# Altium integrated library Diffuser.IntLib: 173 symbols
Pins are listed as number, name and electrical type; pins without a type are passive.

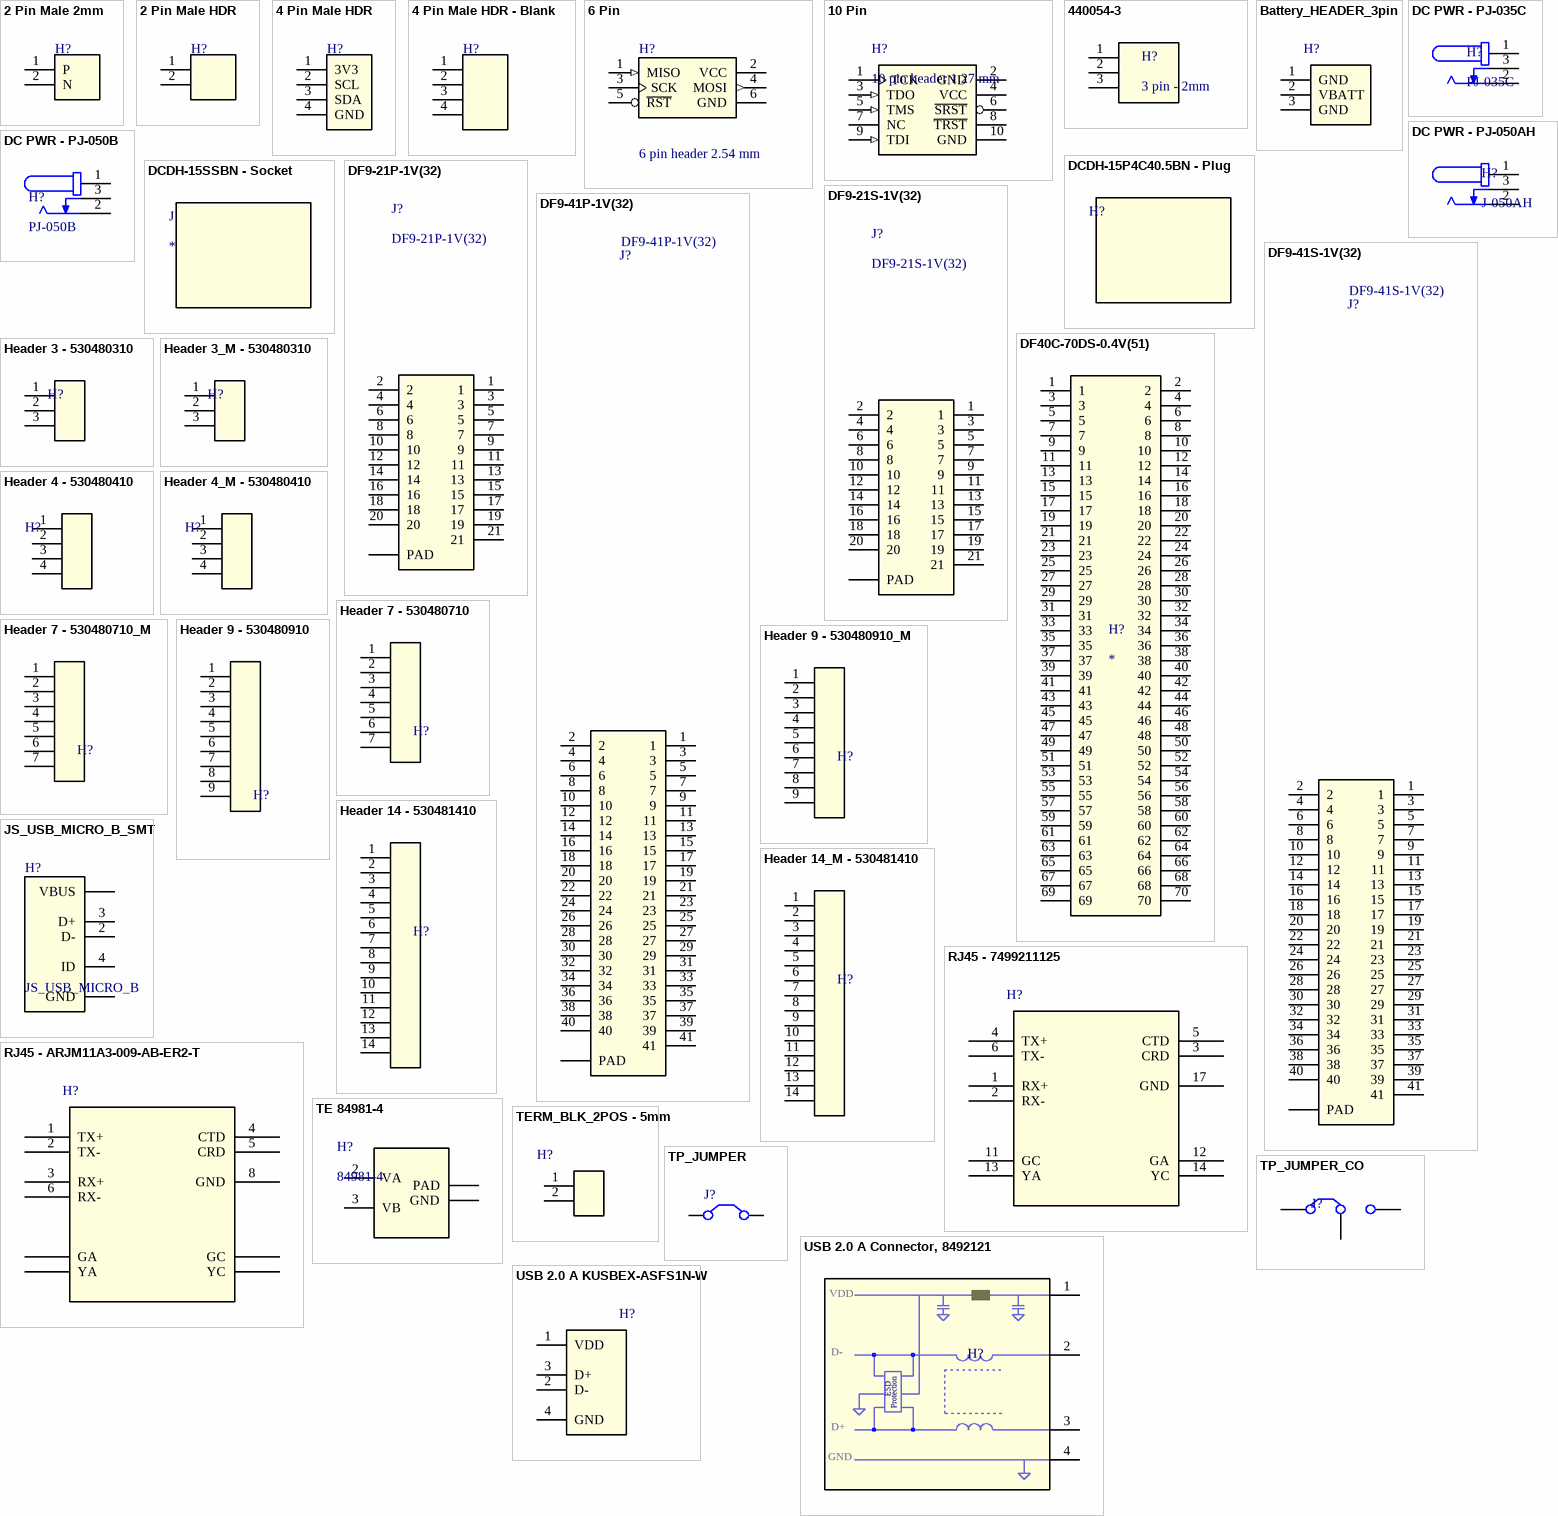
[diagram p0: symbols 2 Pin Male 2mm to USB 2.0 A KUSBEX-ASFS1N-W]

## 2 Pin Male 2mm
designator H?
CONN HDR 2POS 0.1 TIN PCB
footprint JST_B2B-PH-K-S
pins: 1 P, 2 N

## 2 Pin Male HDR
designator H?
CONN HDR 2POS 0.1 TIN PCB
footprint 2 Pin HDR (2.54mm - Single row)
pins: 1, 2

## 4 Pin Male HDR
designator H?
CONN HDR 4POS 0.1 TIN PCB; Website: https://www.digikey.co.nz/product-detail/en/sullins-connector-solutions/PPTC041LFBN-RC/S7002-ND/810144; Cost: 0.71
footprint 4 Pin HDR (2.54mm - Single row)
pins: 1 3V3, 2 SCL, 3 SDA, 4 GND

## 4 Pin Male HDR - Blank
designator H?
CONN HDR 4POS 0.1 TIN PCB; Website: https://www.digikey.co.nz/product-detail/en/sullins-connector-solutions/PPTC041LFBN-RC/S7002-ND/810144; Cost: 0.71
footprint 4 Pin HDR (2.54mm - Single row)
pins: 1, 2, 3, 4

## 6 Pin
designator H?, comment 6 pin header 2.54 mm
IDC Header, 2,54mm, 6-Pin, Vert; Cost: 0.71; Website: https://www.digikey.co.nz/product-detail/en/w%C3%BCrth-elektronik/61200621621/732-5394-ND/4846913
footprint 6PIN (Connector; IDC, Low Profile Male Header, Thru-Hole; 10 Position; Vertical; Pitch 2.54 mm; Body 20.32 x 9.2 x 9.45 mm (LxWxH))
pins: 1 MISO (in), 2 VCC (power), 3 SCK, 4 MOSI (out), 5 ~{RST}, 6 GND (power)

## 10 Pin
designator H?, comment 10 pin header 1.27 mm
CONN HEADER VERT 10POS 1.27MM; Cost_2: 1.02; Cost: 2.21; Website: https://www.digikey.co.nz/product-detail/en/amphenol-icc-fci/20021511-00010T4LF/609-5420-ND/4244984; Website_2: https://www.digikey.co.nz/product-detail/en/cnc-tech/3221-10-0100-00/1175-1733-ND/4878932
footprint 10Pin (1.27mm)
pins: 1 TCK, 2 GND (power), 3 TDO (in), 4 VCC (power), 5 TMS (in), 6 ~{SRST}, 7 NC, 8 ~{TRST}, 9 TDI (in), 10 GND (power)

## 440054-3
designator H?, comment 3 pin - 2mm
2.0MM,HDR,3POS,VERTICAL; Product_Type: Connector; MP: 440054-3; Centerline_Pitch: 2 mm[.079 in]; Number_of_Positions: 3; MF: TE Connectivity; Package: None; Availability: Unavailable; TE_purchase_URL: https://www.te.com/usa-en/product-440054-3.html?te_bu=Cor&te_type=disp&te_campaign=seda_glo_cor-seda-global-disp-prtnr-fy19-seda-model-bom-cta_sma-317_1&elqCampaignId=32493; Value: *; EU_RoHS_Compliance: Compliant; SnapEDA_Link: https://www.snapeda.com/parts/440054-3/TE%20Connectivity%20AMP%20Connectors/view-part/942515/?ref=snap; Price: None
footprint TE_440054-3
pins: 1, 2, 3

## Battery_HEADER_3pin
designator H?  (value not drawn)
3Pin Header 2.54mm spacing - 1 Amp max per wire; Cost_2: 4.18; 9V Cost: 0.82; Cost: 0.41; Website: https://www.digikey.co.nz/product-detail/en/molex/0530470310/WM1732-ND/242854; Website_2: https://www.digikey.co.nz/product-detail/en/molex/0151340300/WM15252-ND/6198142; 9V Bat Con. Website: https://www.digikey.co.nz/product-detail/en/keystone-electronics/232/36-232-ND/303804
footprint BATT_HEADER_3POS
pins: 1 GND (power), 2 VBATT (power), 3 GND (power)

## DC PWR - PJ-035C
designator H?, comment PJ-035C
1.0 x 3.8 mm, 2.0 A, Horizontal, Through Hole, Dc Power Jack Connector; MF: CUI Devices; Cable: 10-02489; CUI_purchase_URL: https://www.cuidevices.com/product/interconnect/connectors/dc-power-connectors/jacks/pj-035c?utm_source=snapeda.com&utm_medium=referral&utm_campaign=snapedaBOM; Purchase-URL: https://pricing.snapeda.com/search/part/PJ-035C/?ref=eda; Digi-Key_Part_Number: CP-035C-ND; SnapEDA_Link: https://www.snapeda.com/parts/PJ-035C/CUI+Devices/view-part/?ref=snap; MP: PJ-035C; Value: *; Check_prices: https://www.snapeda.com/parts/PJ-035C/CUI+Devices/view-part/?ref=eda; Package: None
footprint CUI_PJ-050AH
pins: 1, 2, 3

## DC PWR - PJ-050AH
designator H?, comment J-050AH
Power Barrel Connector Jack 2.10mm ID (0.083"), 5.50mm OD (0.217") Through Hole, Right Angle; DC plug: 172-4204; Cost: 1.97; Website: https://www.digikey.co.nz/en/products/detail/cui-devices/PJ-050AH/1644583
footprint CUI_PJ-050AH
pins: 1, 2, 3

## DC PWR - PJ-050B
designator H?, comment PJ-050B
2.5 mm Center Pin, 2.5 A, Right Angle, Through Hole, Pick-n-Place Top, Dc Power Jack Connector; Cable: CA-2186; MP: PJ-050B
footprint CUI_PJ-050B
pins: 1, 2, 3

## DCDH-15P4C40.5BN - Plug
designator H?
D-Sub Micro-D Connectors 15way Plug 0.5inch 24AWG Sld wire tail
footprint DCDH-15P4C40.5BN - Plug (Footprint not found)

## DCDH-15SSBN - Socket
designator J
D-Sub Micro-D Connectors 15way Socket Solder Cup
footprint DCDH-15SSBN - Socket (Footprint not found)

## DF9-21P-1V(32)
designator J?
21 Position Connector Header, Center Strip Contacts Surface Mount Tin; Mfr_Name: JAE Electronics; Copyright: Copyright (C) 2023 Ultra Librarian. All rights reserved.; Manufacturer_Part_Number: DF9-21P-1V(32); Digi-Key_Part_Number_1: H10415CT-ND; Digi-Key_Part_Number_2: H10415DKR-ND; Digi-Key_Part_Number_3: H10415TR-ND; RefDes: RefDes; Type: DEV
footprint HIROSE_DF9-21P-1V(32)
pins: 1, 2, 3, 4, 5, 6, 7, 8, 9, 10, 11, 12, 13, 14, 15, 16, 17, 18, 19, 20, 21, PAD

## DF9-21S-1V(32)
designator J?
21 Position Connector Header, Center Strip Contacts Surface Mount Tin
footprint HIROSE_DF9-21S-1V(32)
pins: 1, 2, 3, 4, 5, 6, 7, 8, 9, 10, 11, 12, 13, 14, 15, 16, 17, 18, 19, 20, 21, PAD

## DF9-41P-1V(32)
designator J?
Hirose DF9 Series, 1mm Pitch 41 Way 2 Row Straight PCB Header, Solder Termination, 0.5A; Manufacturer_Name: Hirose; Manufacturer_Part_Number: DF9-41P-1V(32); Mouser Part Number: 798-DF9-41P-1V32; Mouser Price/Stock: https://www.mouser.co.uk/ProductDetail/Hirose-Connector/DF9-41P-1V32?qs=zOgoZG1CgI%252BzVCgniEkwOw%3D%3D; Arrow Part Number: DF9-41P-1V(32); Arrow Price/Stock: https://www.arrow.com/en/products/df9-41p-1v-32/hirose-electric; Datasheet Link: http://componentsearchengine.com/Datasheets/1/DF9-41P-1V(32).pdf
footprint HIROSE_DF9-41P-1V(32)
pins: 1, 2, 3, 4, 5, 6, 7, 8, 9, 10, 11, 12, 13, 14, 15, 16, 17, 18, 19, 20, 21, 22, 23, 24, 25, 26, 27, 28, 29, 30, 31, 32, 33, 34, 35, 36, 37, 38, 39, 40, 41, PAD

## DF9-41S-1V(32)
designator J?
Hirose DF9 Series, 1mm Pitch 41 Way 2 Row Straight PCB Header, Solder Termination, 0.5A
footprint HIROSE_DF9-41S-1V(32)
pins: 1, 2, 3, 4, 5, 6, 7, 8, 9, 10, 11, 12, 13, 14, 15, 16, 17, 18, 19, 20, 21, 22, 23, 24, 25, 26, 27, 28, 29, 30, 31, 32, 33, 34, 35, 36, 37, 38, 39, 40, 41, PAD

## DF40C-70DS-0.4V(51)
designator H?
70 Position Connector Receptacle, Center Strip Contacts Surface Mount Gold; MP: DF40C-70DS-0.4V_51_; MF: Hirose; Package: None; SnapEDA_Link: https://www.snapeda.com/parts/DF40C-70DS-0.4V%2851%29/Hirose%20Electric%20Co%20Ltd/view-part/50152/?ref=snap; Price: None; Value: *; Availability: Unavailable
footprint HIROSE_DF40C-70DS-0.4V(51)
pins: 1, 2, 3, 4, 5, 6, 7, 8, 9, 10, 11, 12, 13, 14, 15, 16, 17, 18, 19, 20, 21, 22, 23, 24, 25, 26, 27, 28, 29, 30, 31, 32, 33, 34, 35, 36, 37, 38, 39, 40, 41, 42, 43, 44, 45, 46, 47, 48, 49, 50, 51, 52, 53, 54, 55, 56, 57, 58, 59, 60, 61, 62, 63, 64, 65, 66, 67, 68, 69, 70

## Header 3 - 530480310
designator H?
Connector Header Through Hole, Right Angle 3 position 0.049" (1.25mm); Socket: 0151340302
footprint MOLEX_530480310
pins: 1, 2, 3

## Header 3_M - 530480310
designator H?
Connector Header Through Hole, Right Angle 3 position 0.049" (1.25mm); Socket: 0151340302
footprint MOLEX_530480310_M
pins: 1, 2, 3

## Header 4 - 530480410
designator H?
Connector Header Through Hole, Right Angle 4 position 0.049" (1.25mm); Socket: 0151340402
footprint MOLEX_530480410
pins: 1, 2, 3, 4

## Header 4_M - 530480410
designator H?
Connector Header Through Hole, Right Angle 4 position 0.049" (1.25mm); Socket: 0151340402
footprint MOLEX_530480410_M
pins: 1, 2, 3, 4

## Header 7 - 530480710
designator H?
Connector Header Through Hole, Right Angle 7 position 0.049" (1.25mm); Socket: 0151341402
footprint MOLEX_530480710
pins: 1, 2, 3, 4, 5, 6, 7

## Header 7 - 530480710_M
designator H?
Connector Header Through Hole, Right Angle 7 position 0.049" (1.25mm)
footprint MOLEX_530480710_M
pins: 1, 2, 3, 4, 5, 6, 7

## Header 9 - 530480910
designator H?
Connector Header Through Hole, Right Angle 79position 0.049" (1.25mm)
footprint MOLEX_530480910 (Footprint not found)
pins: 1, 2, 3, 4, 5, 6, 7, 8, 9

## Header 9 - 530480910_M
designator H?
Connector Header Through Hole, Right Angle 9 position 0.049" (1.25mm)
footprint MOLEX_530480910_M (Footprint not found)
pins: 1, 2, 3, 4, 5, 6, 7, 8, 9

## Header 14 - 530481410
designator H?
Connector Header Through Hole, Right Angle 14 position 0.049" (1.25mm); Socket: 0151341402
footprint MOLEX_530481410
pins: 1, 2, 3, 4, 5, 6, 7, 8, 9, 10, 11, 12, 13, 14

## Header 14_M - 530481410
designator H?
Connector Header Through Hole, Right Angle 14 position 0.049" (1.25mm); Socket: 0151341402
footprint MOLEX_530481410_M
pins: 1, 2, 3, 4, 5, 6, 7, 8, 9, 10, 11, 12, 13, 14

## JS_USB_MICRO_B_SMT
designator H?, comment JS_USB_MICRO_B
CONN USB MICRO B RECPT SMT R/A; Manufacturer: FCI; Manufacturer Part Number: 10118194-0001LF; Gender: Receptacle; Number of Contacts: 5; Specifications: USB 2.0; Supplier 1: Digi-Key; Supplier Part Number 1: 609-4618-1-ND; Features: Shielded, Solder Retention; Mounting Type: Surface Mount, Right Angle, Horizontal; Website: https://www.digikey.co.nz/product-detail/en/10118194-0001LF/609-4618-1-ND/2785382?utm_campaign=buynow&utm_medium=aggregator&curr=nzd&utm_source=octopart; Cost: 0.69
footprint JS_USB_MICRO_B (Micro USB B Type Receptacle)
pins: 1 VBUS (power) "Power", 2 D- "-DATA", 3 D+ "+DATA", 4 ID (power) "Ground", GND "Shield"

## RJ45 - 7499211125
designator H?
1 Port RJ45Through Hole 10/100 Base-T, AutoMDIX, Power over Ethernet (PoE); Mfr_Name: Wurth Electronics; RefDes: RefDes; Type: Type
footprint CONN14_11125_WRE
pins: 1 RX+, 2 RX-, 3 CRD, 4 TX+, 5 CTD, 6 TX-, 11 GC, 12 GA, 13 YA, 14 YC, 17 GND

## RJ45 - ARJM11A3-009-AB-ER2-T
designator H?
1 Port RJ45Through Hole 10/100 Base-T, AutoMDIX; Mfr_Name: Wurth Electronics; RefDes: RefDes; Type: Type
footprint ARJM11A3-009-AB-ER2-T
pins: 1 TX+, 2 TX-, 3 RX+, 4 CTD, 5 CRD, 6 RX-, 8 GND, GA, GC, YA, YC

## TE 84981-4
designator H?, comment 84981-4
4 Position FFC, FPC Connector Contacts, Top 0.039" (1.00mm) Surface Mount, Right Angle; Mfr_Name: TE Connectivity; Copyright: Copyright (C) 2023 Ultra Librarian. All rights reserved.; Manufacturer_Part_Number: 84981-4; Digi-Key_Part_Number_1: A101369CT-ND; Digi-Key_Part_Number_2: A101369DKR-ND; Digi-Key_Part_Number_3: A101369TR-ND; RefDes: RefDes; Type: DEV
footprint CONN4_84981-4
pins: 1 GND, 2 VA, 3 VB, PAD

## TERM_BLK_2POS - 5mm
designator H?
TERM BLK 2POS SIDE ENTRY 5mm PCB; Cost_2: 1.58; Website_2: https://www.digikey.co.nz/product-detail/en/weidm%C3%BCller/1760490000/281-2888-ND/492888; Website: https://www.digikey.co.nz/product-detail/en/w%C3%BCrth-elektronik/691137710002/732-10955-ND/6644051; Cost: 0.6; Pitch: 5mm
footprint TERM_BLK_2POS - 5mm
pins: 1, 2

## TP_JUMPER
designator J?
2.54mm Jumper Thru Hole; Pitch Spacing: 2.54; No. of Rows: 1; No. of Positions: 2; Cost_2: 0.13; Supplier: ECE Dept; Storage Location: ECE$ Store; Website: https://www.digikey.co.nz/product-detail/en/sullins-connector-solutions/SPC02SYAN/S9001-ND/76375; Cost: 0.16; Website_2: https://www.digikey.co.nz/product-detail/en/sullins-connector-solutions/PRPC002SAAN-RC/S1011EC-02-ND/2775252
footprint 2 Pin HDR (2.54mm - Single row)
pins: 1 C1, 2 C2

## TP_JUMPER_CO
designator J?
2.54mm Jumper change over, Thru Hole; Cost_2: 0.19; Website: https://www.digikey.co.nz/product-detail/en/sullins-connector-solutions/SPC02SYAN/S9001-ND/76375; Cost: 0.16; Website_2: https://www.digikey.co.nz/product-detail/en/sullins-connector-solutions/PRPC003SAAN-RC/S1011EC-03-ND/2775251
footprint JMP2.54-3 (Jumper Change over 2.54mm)
pins: 1 C1, 2 C2, 3 C3

## USB 2.0 A Connector, 8492121
designator H?
THT USB 2.0 A Connector WE-EPLE; PartNo: 8492121; Manufacturer: Würth Elektronik eiSos GmbH; ComponentLink1Description: Manufacturer; ComponentLink1URL: http://www.we-online.de; Created by: Christin Otto; Created Date: OCT-2014; ComponentLink2Description: Datasheet; ComponentLink2URL: http://www.we-online.de/katalog/media/pdf/8492121.pdf
footprint USB2-WE-EPLE (THT, USB 2.0 A Connector, 4Pin, Body 15.8 x14.5mm)
pins: 1 VBUS, 2 D-, 3 D+, 4 GND
text: VDD; ESD; Protection

## USB 2.0 A KUSBEX-ASFS1N-W
designator H?
THT USB 2.0 A Connector KUSBEX; PartNo: 8492121; Manufacturer: Würth Elektronik eiSos GmbH; ComponentLink1Description: Manufacturer; ComponentLink1URL: http://www.we-online.de; Created by: Christin Otto; Created Date: OCT-2014; ComponentLink2Description: Datasheet; ComponentLink2URL: http://www.we-online.de/katalog/media/pdf/8492121.pdf
footprint USB2-KUSBEX (THT, USB 2.0 A Connector, 4Pin, Body 13.2 x14.1mm)
pins: 1 VDD (power) "Power", 2 D- "-DATA", 3 D+ "+DATA", 4 GND

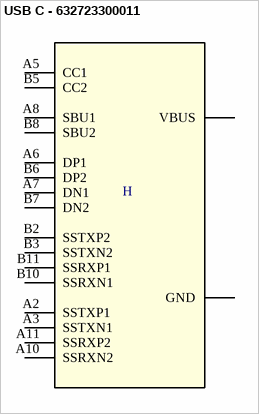
[diagram p1: symbol USB C - 632723300011]

## USB C - 632723300011
designator H
USB-C (USB TYPE-C) USB 3.2 Gen 2 (USB 3.1 Gen 2, Superspeed + (USB 3.1)) Receptacle Connector 24 Position Surface Mount, Right Angle; Through Hole; MF: Wurth Elektronik; MP: 632723300011; Value: *; Check_prices: https://www.snapeda.com/parts/632723300011/Wurth+Elektronik/view-part/?ref=eda; SnapEDA_Link: https://www.snapeda.com/parts/632723300011/Wurth+Elektronik/view-part/?ref=snap; Availability: In Stock; Purchase-URL: https://pricing.snapeda.com/search/part/632723300011/?ref=eda; Package: None; Price: None
footprint WURTH_632723X00011
pins: A2 SSTXP1, A3 SSTXN1, A5 CC1, A6 DP1, A7 DN1, A8 SBU1, A10 SSRXN2, A11 SSRXP2, B2 SSTXP2, B3 SSTXN2, B5 CC2, B6 DP2, B7 DN2, B8 SBU2, B10 SSRXN1, B11 SSRXP1, GND (power), VBUS (power)


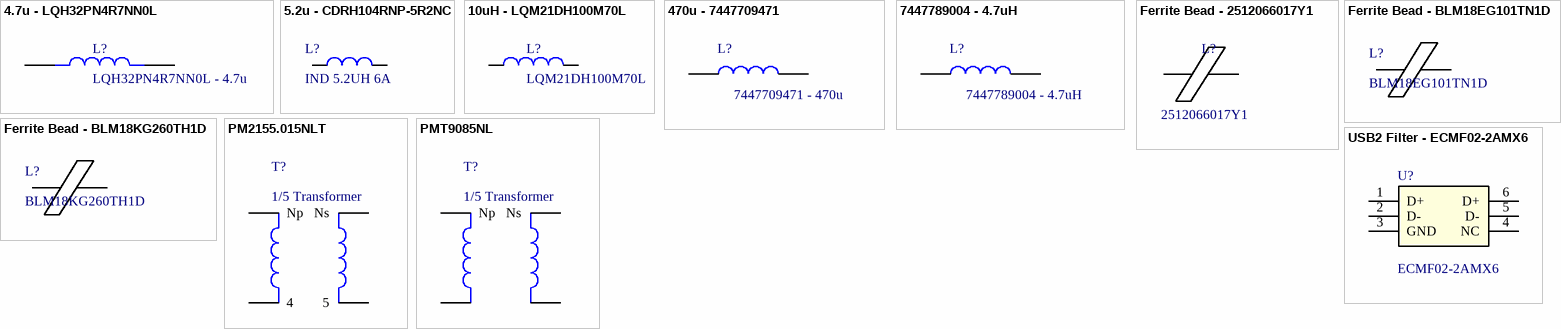
[diagram p2: symbols 4.7u - LQH32PN4R7NN0L to USB2 Filter - ECMF02-2AMX6]

## 4.7u - LQH32PN4R7NN0L
designator L?, comment LQH32PN4R7NN0L - 4.7u
Inductor with Inductance: 4.7uH Tol. +/-30%, Package: 1210 _3225_; MF: Murata; Value: *; Price: None; Package: Nonstandard Murata; SnapEDA_Link: https://www.snapeda.com/parts/LQH32PN4R7NN0L/Murata/view-part/4548733/?ref=snap; Availability: Unavailable; MP: LQH32PN4R7NN0L
footprint IND_LQH32PN4R7NN0L
pins: 1, 2

## 5.2u - CDRH104RNP-5R2NC
designator L?, comment IND 5.2UH 6A
FIXED IND 5.2UH 6A 22mR SMD; Manufacturer: Sumida America Components Inc.; Manufacturer Part Number: CDRH104RNP-5R2NC; Material - Core: Ferrite; Tolerance: ±30%; Current - Saturation: 5.6A; Shielding: Shielded; DC Resistance (DCR): 22 mOhm Max; Supplier 1: Digi-Key; RoHS: RoHS Compliant; Category: Inductors, Coils, Chokes; Stock 1: 3849; Pricing 1: 1=2.9, 10=2.678, 100=1.8743, 500=1.5173 (NZD); Packaging: Cut Tape (CT); Part Status: Active; Type: -; Q @ Freq: -; Frequency - Self Resonant: -; Ratings: -; Operating Temperature: -40°C ~ 100°C; Mounting Type: Surface Mount; Package / Case: Nonstandard; Supplier Device Package: -; Size / Dimension: 0.402" L x 0.394" W (10.20mm x 10.00mm); Height - Seated (Max): 0.157" (4.00mm); ComponentLink1URL: http://products.sumida.com/products/pdf/CDRH104R.pdf; ComponentLink1Description: http://products.sumida.com/products/pdf/CDRH104R.pdf; Supplier Part Number 1: 308-2280-1-ND; Cost: 2.79; Website: https://www.digikey.co.nz/product-detail/en/sumida-america-components-inc/CDRH104RNP-5R2NC/308-2280-1-ND/4356350
footprint 5.2uH CDRH104RNP-5R2NC
pins: 1, 2

## 10uH - LQM21DH100M70L
designator L?, comment LQM21DH100M70L
Inductor with Inductance: 10uH Tol. +/-20%, Package: 0805 (2012); Cost: 0.43; Website: https://www.digikey.co.nz/products/en?keywords=490-18463-1-ND
footprint R_0805 (2.0x1.25mm)
pins: 1, 2

## 470u - 7447709471
designator L?, comment 7447709471 - 470u
FIXED IND 470UH 1.4A 560MOHM SMD; Manufacturer_Name: Wurth Elektronik; Manufacturer_Part_Number: 7447709471; Mouser Part Number: 710-7447709471; Mouser Price/Stock: https://www.mouser.co.uk/ProductDetail/Wurth-Elektronik/7447709471?qs=E%2F%2FhvbtCqpPDFF5ZuHB1Jw%3D%3D; Arrow Part Number: *; Arrow Price/Stock: *; Mouser Testing Part Number: *; Mouser Testing Price/Stock: *; Datasheet Link: http://componentsearchengine.com/Datasheets/1/7447709471.pdf
footprint IND_1210-WE-PD_WRE-M
pins: 1, 2

## 7447789004 - 4.7uH
designator L?
4.7 µH Shielded Drum Core, Wirewound Inductor 2.9 A 35mOhm Max Nonstandard
footprint 7447789004 - 4.7uH
pins: 1, 2

## Ferrite Bead - 2512066017Y1
designator L?, comment 2512066017Y1
Ferrite Bead, Rdc 0.3R, Z100MHZ 600R, Imax 1A, SMD 1206; Manufacturer: FAIR-RITE; DC Current Rating: 1; DC Resistance Max: 0.08; Ferrite Case Style: 1206 ^3216 Metric]; Frequency Range: 50MHz to 1; Impedance: 600; Impedance Tolerance: ± 25%; Manufacturer PN: 2512066017Y1; Supplier: ECE Dept; Storage Location: PCB Assembly WS; Ferrite Mounting: SMD; Supplier 1: Farnell; Supplier Part Number 1: 1612060; Manufacturer Part Number: 2512066017Y1; Website: https://www.digikey.co.nz/product-detail/en/fair-rite-products-corp/2512066017Y1/1934-1489-1-ND/8594408; Cost: 0.2; Value: 2512066017Y1
footprint R_1206 (Chip Inductor, Body 3.2x1.6mm, IPC Low Density)
pins: 1, 2

## Ferrite Bead - BLM18EG101TN1D
designator L?, comment BLM18EG101TN1D
100 Ohms @ 100 MHz 1 Ferrite Bead 0603 (1608 Metric) 2A 45mOhm; Mfr_Name: Murata; Type: DEV; Copyright: Copyright (C) 2023 Ultra Librarian. All rights reserved.; Manufacturer_Part_Number: BLM18EG101TN1D; Digi-Key_Part_Number_1: 490-5978-1-ND; Digi-Key_Part_Number_2: 490-5978-2-ND; Digi-Key_Part_Number_3: 490-5978-6-ND; RefDes: RefDes
footprint IND_BLM18_0603_MUR-M
pins: 1, 2

## Ferrite Bead - BLM18KG260TH1D
designator L?, comment BLM18KG260TH1D
26 Ohms @ 100 MHz 1 Power Line Ferrite Bead 0603 (1608 Metric) 6A 7mOhm
footprint IND_BLM18_0603_MUR-M
pins: 1, 2

## PM2155.015NLT
designator T?, comment 1/5 Transformer
footprint PM2155.015NLT (1/5 Transformer)
pins: 1 Np, 4, 5, 8 Ns

## PMT9085NL
designator T?, comment 1/5 Transformer
160µH Gate Drive Pulse Transformer 1CT:5CT Surface Mount
footprint PMT9085NL (1/5 Transformer)
pins: 1 Np, 3, 4, 6 Ns

## USB2 Filter - ECMF02-2AMX6
designator U?, comment ECMF02-2AMX6
Common Mode Filter & ESD Prot. USB uQFN6 STMicroelectronics ECMF02 Series, Signal Filter, 200mA uQFN SMD, Flat Contact Termination, 1.8 x 1.6 x 0.5mm; Geometry.Height: 0.55mm; Manufacturer_Name: STMicroelectronics; Manufacturer_Part_Number: ECMF02-2AMX6; Mouser Part Number: 511-ECMF02-2AMX6; Mouser Price/Stock: https://www.mouser.co.uk/ProductDetail/STMicroelectronics/ECMF02-2AMX6?qs=raAh8RbVwI65u5gmT42%2Flg%3D%3D; Arrow Part Number: ECMF02-2AMX6; Arrow Price/Stock: https://www.arrow.com/en/products/ecmf02-2amx6/stmicroelectronics?region=nac; Mouser Testing Part Number: *; Mouser Testing Price/Stock: *; Datasheet Link: http://www.st.com/content/ccc/resource/technical/document/datasheet/3a/28/cf/d0/31/63/48/8c/CD00282307.pdf/files/CD00282307.pdf/jcr:content/translations/en.CD00282307.pdf
footprint SON50P150X170X55-6N-D
pins: 1 D+, 2 D-, 3 GND, 4 NC, 5 D-, 6 D+


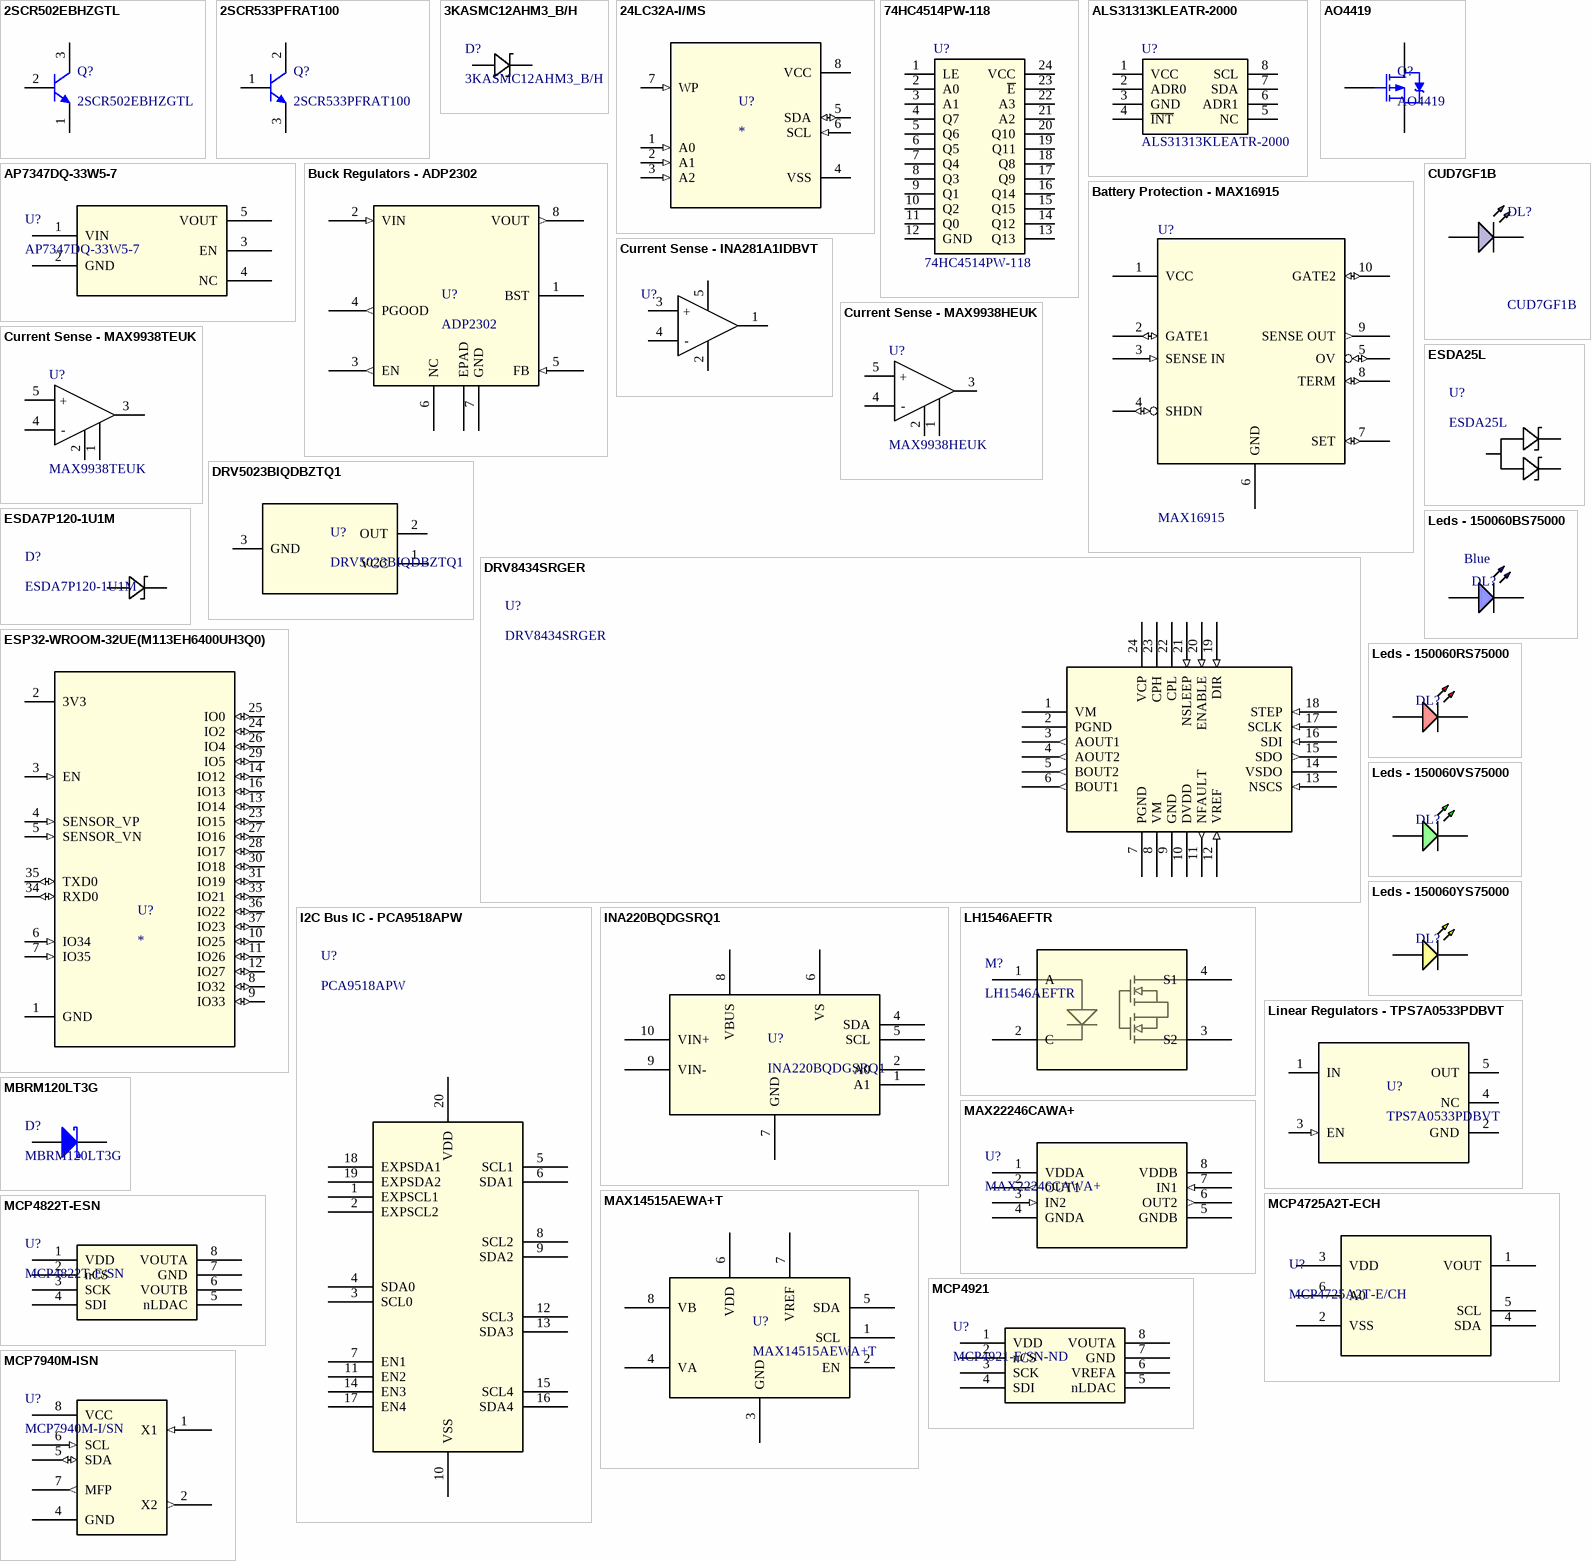
[diagram p3: symbols 2SCR502EBHZGTL to MCP7940M-ISN]

## 2SCR502EBHZGTL
designator Q?
Bipolar (BJT) Transistor NPN 30 V 500 mA 360MHz 150 mW Surface Mount EMT3F (SOT-416FL)
footprint TRANS_DTA114EEBHZ_ROM-M
pins: 1, 2 Base, 3

## 2SCR533PFRAT100
designator Q?
TRANS NPN 50V 3A MPT3; Mfr_Name: ROHM Semiconductor; Type: DEV; Copyright: Copyright (C) 2023 Ultra Librarian. All rights reserved.; Manufacturer_Part_Number: 2SCR533PFRAT100; Digi-Key_Part_Number_1: 2SCR533PFRAT100CT-ND; Digi-Key_Part_Number_2: 2SCR533PFRAT100DKR-ND; Digi-Key_Part_Number_3: 2SCR533PFRAT100TR-ND; RefDes: RefDes
footprint TRANS_2SA2071P_ROM-M
pins: 1 "Base", 2, 3

## 3KASMC12AHM3_B/H
designator D?
19.9V Clamp 151A Ipp Tvs Diode Surface Mount DO-214AB (SMCJ); Mfr_Name: Littelfuse Inc; Manufacturer_Part_Number: 1.5SMC400A; Type: DEV; Copyright: Copyright (C) 2023 Ultra Librarian. All rights reserved.; RefDes: RefDes
footprint DO-214AB_SMC
pins: 1, 2

## 24LC32A-I/MS
designator U?
EEPROM Memory IC 32Kb _4K x 8_ IÂ²C 400kHz 900ns 8-MSOP; MP: 24LC32A-I/MS; MF: Microchip; Package: MSOP-8 Microchip; Price: None; Availability: Unavailable; SnapEDA_Link: https://www.snapeda.com/parts/24LC32A-I/MS/Microchip/view-part/138508/?ref=snap; Value: *
footprint SOP65P490X110-8N
pins: 1 A0 (in), 2 A1 (in), 3 A2 (in), 4 VSS (power), 5 SDA (io), 6 SCL (in), 7 WP (in), 8 VCC (power)

## 74HC4514PW-118
designator U?
74HC(T)4514 - 4-to-16 line decoder/demultiplexer with input latches@en-us; Manufacturer_Name: Nexperia; Manufacturer_Part_Number: 74HC4514PW,118; Geometry.Height: 1.1mm; Mouser Part Number: 771-HC4514PW118; Mouser Price/Stock: https://www.mouser.co.uk/ProductDetail/Nexperia/74HC4514PW118?qs=P62ublwmbi%2F4NHTNGiPEGA%3D%3D; Datasheet Link: https://assets.nexperia.com/documents/data-sheet/74HC_HCT4514.pdf
footprint SOP65P640X110-24N
pins: 1 LE, 2 A0, 3 A1, 4 Q7, 5 Q6, 6 Q5, 7 Q4, 8 Q3, 9 Q1, 10 Q2, 11 Q0, 12 GND, 13 Q13, 14 Q12, 15 Q15, 16 Q14, 17 Q9, 18 Q8, 19 Q11, 20 Q10, 21 A2, 22 A3, 23 ~{E}, 24 VCC

## ALS31313KLEATR-2000
designator U?
Automotive 3D Linear Hall-Effect Sensor; Manufacturer_Name: Allegro Microsystems; Manufacturer_Part_Number: ALS31313KLEATR-500; Geometry.Height: 1.1mm; Mouser Part Number: 250-31313KLEATR500; Mouser Price/Stock: https://www.mouser.co.uk/ProductDetail/Allegro-MicroSystems/ALS31313KLEATR-500?qs=pUKx8fyJudA8q1d4TsW3WA%3D%3D; Arrow Part Number: ALS31313KLEATR-500; Arrow Price/Stock: https://www.arrow.com/en/products/als31313kleatr-500/allegro-microsystems; Mouser Testing Part Number: *; Mouser Testing Price/Stock: *; Datasheet Link: http://www.farnell.com/datasheets/2720004.pdf
footprint A1162LLETRT
pins: 1 VCC, 2 ADR0, 3 GND, 4 ~{INT}, 5 NC, 6 ADR1, 7 SDA, 8 SCL

## AO4419
designator Q?
P-Channel 30 V 9.7A (Ta) 3.1W (Ta) Surface Mount 8-SOIC
footprint SO08-E3
pins: 1-3 2 "Source", 4 1 "Gate", 5-8 3 "Drain"

## AP7347DQ-33W5-7
designator U?
Linear Voltage Regulator IC Positive Fixed 1 Output 500mA SOT-25; Mfr_Name: Diodes Inc; Type: DEV; Copyright: Copyright (C) 2024 Ultra Librarian. All rights reserved.; Manufacturer_Part_Number: AP7347DQ-33W5-7; RefDes: RefDes
footprint SOT25-A1_DIO-M
pins: 1 VIN (power), 2 GND (power), 3 EN, 4 NC, 5 VOUT

## Battery Protection - MAX16915
designator U?, comment MAX16915
IC BATT PROTECTION 10UMAX; Manufacturer_Part_Number: MAX16915AUB+; Vendor: Maxim Integrated Products; Built_By: EMA_UL_Team; SourceLibrary: Maxim_2014-04-30_1; Revision: 2; Copyright: Copyright (C) 2021 Accelerated Designs. All rights reserved; RefDes: RefDes; Type: DEV; Cost: 3.09; Website: https://www.digikey.co.nz/product-detail/en/maxim-integrated/MAX16915AUB/MAX16915AUB-ND/3975854
footprint 10-uMAX_uSOP
pins: 1 VCC (power), 2 GATE1 (io), 3 SENSE IN (in), 4 SHDN (io), 5 OV (io), 6 GND (power), 7 SET (io), 8 TERM (io), 9 SENSE OUT (out), 10 GATE2 (io)

## Buck Regulators - ADP2302
designator U?, comment ADP2302
IC REG BUCK 5V 2A 8SOIC; Cost: 4.97000; Website: https://www.digikey.co.nz/product-detail/en/analog-devices-inc/ADP2302ARDZ-5-0-R7/ADP2302ARDZ-5-0-R7CT-ND/2615949
footprint 8-SOIC
pins: 1 BST, 2 VIN (in), 3 EN (out), 4 PGOOD (out), 5 FB (in), 6 NC, 7 GND (power), 8 VOUT (out), EPAD

## CUD7GF1B
designator DL?
Deep ultraviolet light emitting diode with peak emission wavelengths from 270nm to 280nm; Manufacturer_Name: SEOUL VIOSYS; Dot: Cathode; Manufacturer_Part_Number: CUD7GF1B; Mouser Part Number: *; Mouser Price/Stock: *; Arrow Part Number: *; Arrow Price/Stock: *; Mouser Testing Part Number: *; Mouser Testing Price/Stock: *; Datasheet Link: http://www.s-et.com/upload2/CUD7GF1B_R2.0.pdf
footprint CUD7GF1B
pins: 1, 2-3 A

## Current Sense - INA281A1IDBVT
designator U?  (value not drawn)
INA293 FAMILY-HIGH-PRECISION CSA; Manufacturer: Texas Instruments; PartNumber: INA281A1IDBVR; RefDes: RefDes; Type: DEV; Value: Value; Copyright: Copyright (C) 2021 Accelerated Designs. All rights reserved; Cost: 4.15; Website: https://www.digikey.co.nz/product-detail/en/texas-instruments/INA281B1IDBVR/296-INA281B1IDBVRCT-ND/13238613
footprint SOT-23-5
pins: 1 OUT, 2 GND (power), 3 IN+ (hiz), 4 IN- (hiz), 5 VS (power)
text: +; -

## Current Sense - MAX9938HEUK
designator U?  Part: MAX9938HEUK  (hidden comment: *)
IC CURR SENSE 1 CIRCUIT SOT23-5; Gain: 100 V/V; Cost: 2.19; Website: https://www.digikey.co.nz/product-detail/en/maxim-integrated/MAX9938HEUK-T/MAX9938HEUK-TCT-ND/2234739
footprint SOT-23-5
pins: 1 GND (power), 2 GND (power), 3 Out, 4 RS- (hiz), 5 RS+ (hiz)
text: +; -

## Current Sense - MAX9938TEUK
designator U?  Part: MAX9938TEUK  (hidden comment: *)
IC CURR SENSE 1 CIRCUIT SOT23-5; Gain: 25 V/V; Cost: 2.19; Website: https://www.digikey.co.nz/product-detail/en/maxim-integrated/MAX9938TEUK-T/MAX9938TEUK-TCT-ND/2234740
footprint SOT-23-5
pins: 1 GND (power), 2 GND (power), 3 OUT, 4 RS- (hiz), 5 RS+ (hiz)
text: +; -

## DRV5023BIQDBZTQ1
designator U?
MAGNETIC SWITCH UNIPOLAR SOT23-3; Mfr_Name: Texas Instruments; Type: DEV; RefDes: RefDes; Copyright: Copyright (C) 2023 Ultra Librarian. All rights reserved.; Manufacturer_Part_Number: DRV5023BIQDBZTQ1; Digi-Key_Part_Number_1: 2156-DRV5023BIQDBZTQ1-ND; Digi-Key_Part_Number_2: 296-DRV5023BIQDBZTQ1CT-ND; Digi-Key_Part_Number_3: 296-DRV5023BIQDBZTQ1DKR-ND; Digi-Key_Part_Number_4: 296-DRV5023BIQDBZTQ1TR-ND; Digi-Key_Part_Number_5: DRV5023BIQDBZTQ1-ND
footprint DBZ0003A_M
pins: 1 VCC (power), 2 OUT (oc), 3 GND (power)

## DRV8434SRGER
designator U?
48-V, 2.5-A BIPOLAR STEPPER MOTOR; Mfr_Name: Texas Instruments; Copyright: Copyright (C) 2023 Ultra Librarian. All rights reserved.; Manufacturer_Part_Number: DRV8434SRGER; Digi-Key_Part_Number_1: 296-DRV8434SRGERCT-ND; Digi-Key_Part_Number_2: 296-DRV8434SRGERDKR-ND; Digi-Key_Part_Number_3: 296-DRV8434SRGERTR-ND; RefDes: RefDes; Type: DEV
footprint RGE0024B_TEX-M
pins: 1 VM (power), 2 PGND (power), 3 AOUT1 (out), 4 AOUT2 (out), 5 BOUT2 (out), 6 BOUT1 (out), 7 PGND (power), 8 VM (power), 9 GND (power), 10 DVDD (power), 11 NFAULT (out), 12 VREF (in), 13 NSCS (in), 14 VSDO (power), 15 SDO (out), 16 SDI (in), 17 SCLK (in), 18 STEP (in), 19 DIR (in), 20 ENABLE (in), 21 NSLEEP (in), 22 CPL (power), 23 CPH (power), 24 VCP (power)

## ESDA7P120-1U1M
designator D?
11.5V Clamp 120A (8/20µs) Ipp Tvs Diode Surface Mount 1610; Mfr_Name: STMicroelectronics; Type: DEV; Copyright: Copyright (C) 2023 Ultra Librarian. All rights reserved.; Manufacturer_Part_Number: ESDA7P120-1U1M; RefDes: RefDes
footprint DIODE_ESDA7P120-1U1M_STM-M
pins: 1, 2

## ESDA25L
designator U?
Clamp Ipp Tvs Diode Surface Mount SOT-23-3; Mfr_Name: STMicroelectronics; Copyright: Copyright (C) 2023 Ultra Librarian. All rights reserved.; Manufacturer_Part_Number: ESDA25L; Digi-Key_Part_Number_1: 497-4642-1-ND; Digi-Key_Part_Number_2: 497-4642-2-ND; Digi-Key_Part_Number_3: 497-4642-6-ND; RefDes: RefDes; Type: DEV
footprint SOT_A25L_STM-M (Footprint not found)
pins: 1, 2, 3

## ESP32-WROOM-32UE(M113EH6400UH3Q0)
designator U?
Bluetooth, WiFi 802.11b/g/n, Bluetooth v4.2 +EDR, Class 1, 2 and 3 Transceiver Module 2.4GHz ~ 2.5GHz Antenna Not Included, U.FL Surface Mount; MF: Espressif Systems; MP: ESP32-WROOM-32UE(M113EH6400UH3Q0); Price: None; Check_prices: https://www.snapeda.com/parts/ESP32-WROOM-32UE(M113EH6400UH3Q0)/Espressif+Systems/view-part/?ref=eda; Value: *; Package: None; SnapEDA_Link: https://www.snapeda.com/parts/ESP32-WROOM-32UE(M113EH6400UH3Q0)/Espressif+Systems/view-part/?ref=snap; Availability: Not in stock
footprint MODULE_ESP32-WROOM-32UE(M113EH6400UH3Q0)
pins: 1 GND (power), 2 3V3 (power), 3 EN (in), 4 SENSOR_VP (in), 5 SENSOR_VN (in), 6 IO34 (in), 7 IO35 (in), 8 IO32 (io), 9 IO33 (io), 10 IO25 (io), 11 IO26 (io), 12 IO27 (io), 13 IO14 (io), 14 IO12 (io), 16 IO13 (io), 23 IO15 (io), 24 IO2 (io), 25 IO0 (io), 26 IO4 (io), 27 IO16 (io), 28 IO17 (io), 29 IO5 (io), 30 IO18 (io), 31 IO19 (io), 33 IO21 (io), 34 RXD0 (io), 35 TXD0 (io), 36 IO22 (io), 37 IO23 (io)

## I2C Bus IC - PCA9518APW
designator U?, comment PCA9518APW
IC INTERFACE SPECIALIZED 20TSSOP; Vendor: NXP; Built_By: EMA_UL_Team; SourceLibrary: NXP_2011-11-10; Manufacturer_Part_Number: PCA9518APW; Copyright: Copyright (C) 2021 Accelerated Designs. All rights reserved; RefDes: RefDes; Type: DEV; Cost: 4.13; Website: https://www.digikey.co.nz/product-detail/en/nxp-usa-inc/PCA9518APW-518/568-13610-1-ND/7776747
footprint 20-TSSOP
pins: 1 EXPSCL1, 2 EXPSCL2, 3 SCL0, 4 SDA0, 5 SCL1, 6 SDA1, 7 EN1, 8 SCL2, 9 SDA2, 10 VSS, 11 EN2, 12 SCL3, 13 SDA3, 14 EN3, 15 SCL4, 16 SDA4, 17 EN4, 18 EXPSDA1, 19 EXPSDA2, 20 VDD

## INA220BQDGSRQ1
designator U?
Current, Voltage, & Power Monitor Regulator High/Low-Side 10mA 10-VSSOP; Mfr_Name: Texas Instruments; Replacement part: INA220BIDGST; Copyright: Copyright (C) 2023 Ultra Librarian. All rights reserved.; Manufacturer_Part_Number: INA220BQDGSRQ1; Digi-Key_Part_Number_1: 296-36593-1-ND; Digi-Key_Part_Number_2: 296-36593-2-ND; Digi-Key_Part_Number_3: 296-36593-6-ND; Digi-Key_Part_Number_4: 2156-INA220BQDGSRQ1-ND; RefDes: RefDes; Type: DEV
footprint DGS10-L
pins: 1 A1, 2 A0, 4 SDA, 5 SCL, 6 VS (power), 7 GND (power), 8 VBUS (power), 9 VIN-, 10 VIN+

## Leds - 150060BS75000
designator DL?, comment Blue
LED Blue 270mcd 0603 SMD; Cost: 0.25; Website: https://www.digikey.co.nz/product-detail/en/w%C3%BCrth-elektronik/150060BS75000/732-4966-1-ND/4489893; LED Colour: Blue
footprint WL-SMCW0603 (2.4 x 0.8 x 0.7mm LED)
pins: 1 K, 2 A

## Leds - 150060RS75000
designator DL?, comment Red  (value not drawn)
LED Red 250mcd 0603 SMD; Cost: 0.25; Website: https://www.digikey.co.nz/product-detail/en/w%C3%BCrth-elektronik/150060RS75000/732-4978-1-ND/4489899
footprint WL-SMCW0603 (2.4 x 0.8 x 0.7mm LED)
pins: 1 K, 2 A

## Leds - 150060VS75000
designator DL?, comment Green  (value not drawn)
LED Green 40mcd 0603 SMD; Cost: 0.25; Website: https://www.digikey.co.nz/product-detail/en/w%C3%BCrth-elektronik/150060VS75000/732-4980-1-ND/4489904
footprint WL-SMCW0603 (2.4 x 0.8 x 0.7mm LED)
pins: 1 K, 2 A

## Leds - 150060YS75000
designator DL?, comment Yellow  (value not drawn)
LED Yellow 120mcd 0603 SMD; Cost: 0.25; Website: https://www.digikey.co.nz/product-detail/en/w%C3%BCrth-elektronik/150060YS75000/732-4981-1-ND/4489907
footprint WL-SMCW0603 (2.4 x 0.8 x 0.7mm LED)
pins: 1 K, 2 A

## LH1546AEFTR
designator M?
Solid State SPST-NO (1 Form A) 4-SOP (0.173", 4.40mm); Mfr_Name: Vishay; Copyright: Copyright (C) 2024 Ultra Librarian. All rights reserved.; Manufacturer_Part_Number: LH1546AEFTR; RefDes: RefDes; Type: DEV
footprint SO_6AEFTR_VIS-M
pins: 1 A, 2 C, 3 S2, 4 S1

## Linear Regulators - TPS7A0533PDBVT
designator U?, comment TPS7A0533PDBVT